# Altium footprint library Alhambra_II.PcbLib: 43 footprints (part 2 of 3)
Each footprint in its own frame and in the unit in brackets; x right, y up, seen from the top. Pads: shape width x height; smd on the part's side, far side on the other; paste and mask are expansions set on the pad; w line width, h text height; cw(c..) or ccw(c..) is an arc to the next point about the centre after c.
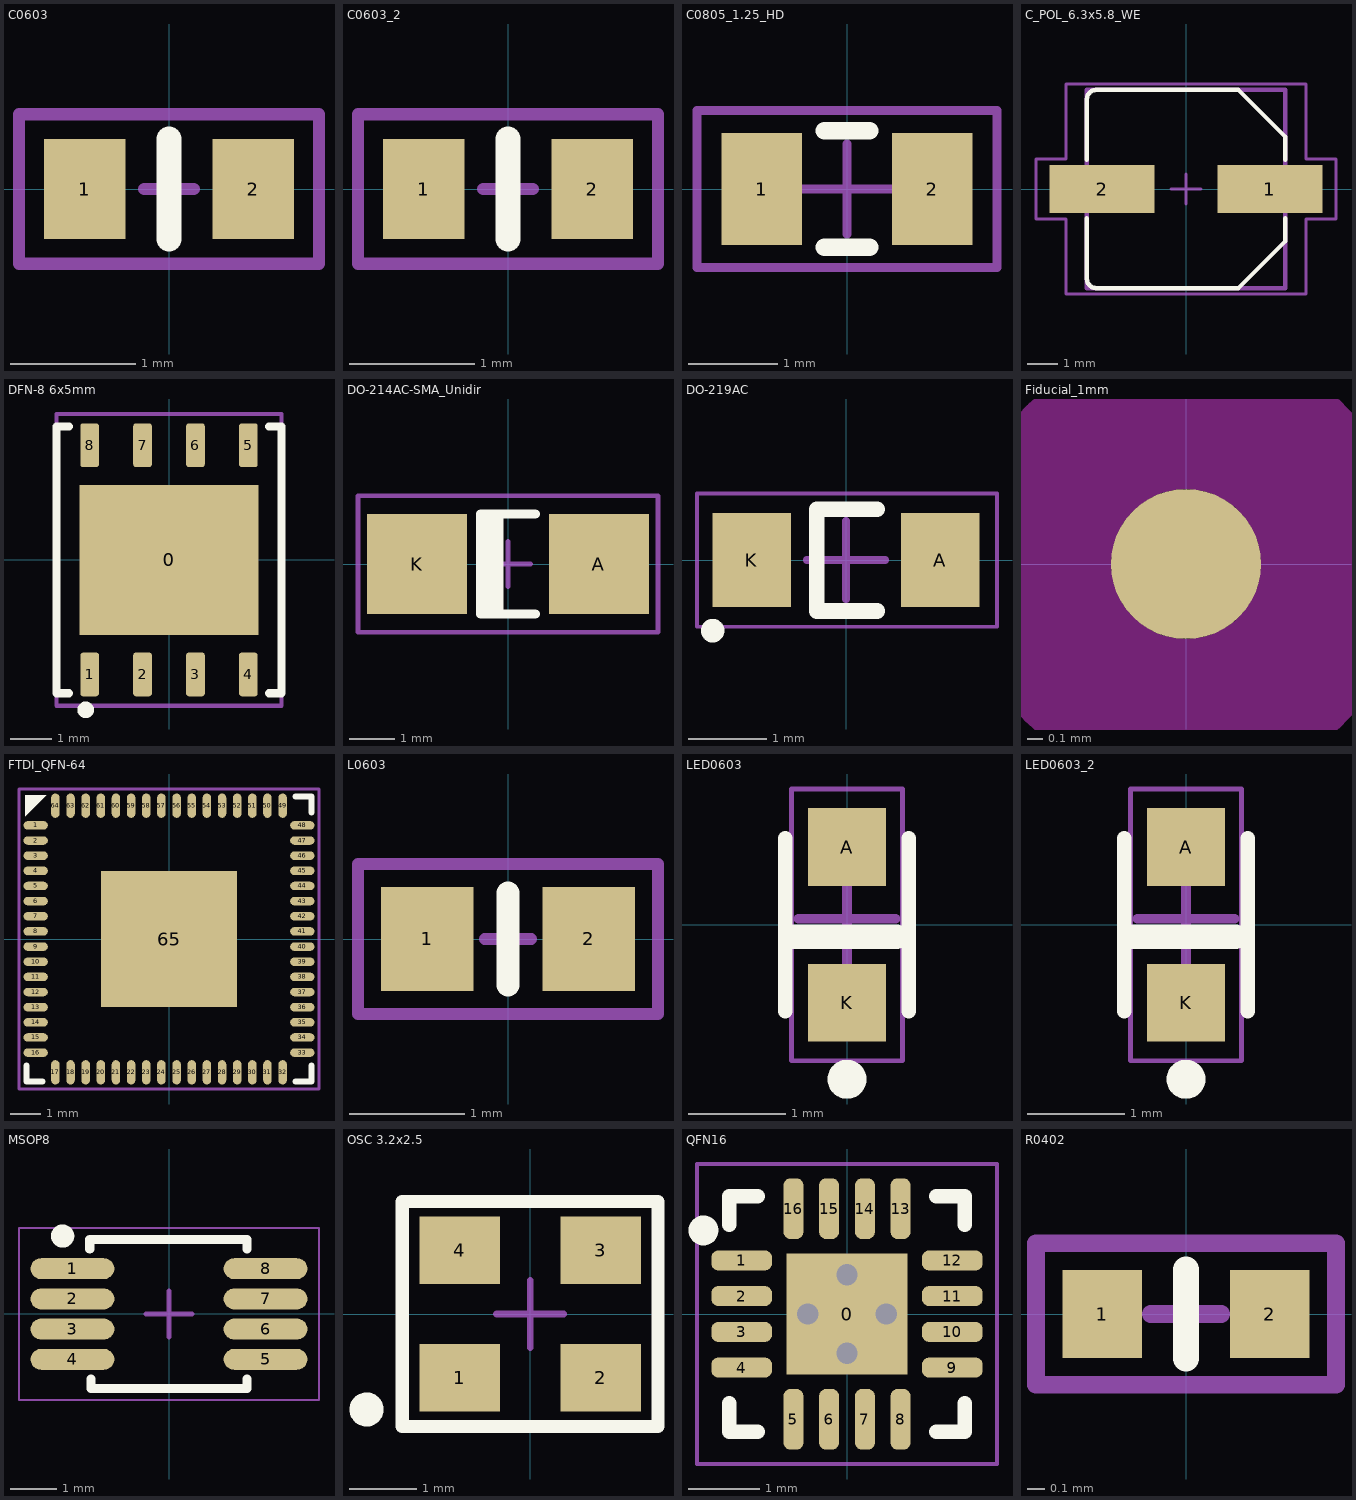
[diagram p1: the footprints below, top view; thin cyan lines are the x and y axes]

## C0603 [mm] "Chip Capacitor, Body 1.6x0.8mm, IPC High Density"
height 0.35
pads (2):
  rect 0.65x0.8 smd: 1(-0.675,0) 2(0.675,0)
Top Overlay:
  lines w0.2: 0,-0.4 0,0.4
Mechanical 15:
  lines w0.1: -0.2,0 0.2,0 ; 0,-0.2 0,0.2 ; -1.2,-0.6 -1.2,0.6 1.2,0.6 1.2,-0.6 -1.2,-0.6
3D body "C_0603.step": height 0.6, standoff 0, extent -0.8,-0.4 0.8,0.4

## C0603_2 [mm]
pads (2):
  rect 0.65x0.8 smd: 1(-0.675,0) 2(0.675,0)
Top Overlay:
  lines w0.2: 0,-0.4 0,0.4
Mechanical 15:
  lines w0.1: -0.2,0 0.2,0 ; 0,-0.2 0,0.2 ; -1.2,-0.6 1.2,-0.6 1.2,0.6 -1.2,0.6 -1.2,-0.6
3D body "C_0603.step": height 0.6, standoff 0, extent -0.8,-0.4 0.8,0.4

## C0805_1.25_HD [mm] "Chip Capacitor, Body 2.0x1.25mm, High Density"
height 1.25
pads (2):
  rect 0.9x1.25 smd: 1(-0.95,0) 2(0.95,0)
Top Overlay:
  lines w0.2: -0.25,-0.65 0.25,-0.65 ; -0.25,0.65 0.25,0.65
Mechanical 15:
  lines w0.1: -0.5,0 0.5,0 ; 0,-0.5 0,0.5 ; -1.675,-0.875 -1.675,0.875 1.675,0.875 1.675,-0.875 -1.675,-0.875
3D body "C0805_1.25.step": height 1.25, standoff 0, extent -1,-0.625 1,0.625

## C_POL_6.3x5.8_WE [mm] "Aluminium Polymer V-Chip SMT Capacitors, §¶6.3x5.8mm"
height 5.8
pads (2):
  rect 3.5x1.6 smd: 1(2.8,0) 2(-2.8,0)
Top Overlay:
  lines w0.15: -3.3,-3 ccw(c-3,-3) -3,-3.3 1.75,-3.3 3.3,-1.75 3.3,-0.98 ; -3.3,-2.99 -3.3,-0.98 ; -3.3,0.98 -3.3,2.99 ; -3.3,3 cw(c-3,3) -3,3.3 1.75,3.3 3.3,1.75 3.3,0.98
Mechanical 13:
  lines w0.15: -3.3,-3.3 -3.3,3.3 3.3,3.3 3.3,-3.3 -3.3,-3.3
Mechanical 15:
  lines w0.1: -0.5,0 0.5,0 ; 0,-0.5 0,0.5 ; -5,-1 -4,-1 -4,-3.5 4,-3.5 4,-1 5,-1 5,1 4,1 4,3.5 -4,3.5 -4,1 -5,1 -5,-1
3D body "plsp 6_3x5_8x2_220.step": height 5.8, standoff 0, extent -3.65,-3.3 3.65,3.3

## DFN-8 6x5mm [mm] "V-PDFN-8 (MLP8), 6x5mm, 8 pin, 1.27mm Pitch"
height 0.85
pads (9):
  rect 4.3x3.6 smd paste-5: 0(0,0)
  rrect30% 0.45x1.05 smd: 1(-1.905,-2.75) 2(-0.635,-2.75) 3(0.635,-2.75) 4(1.905,-2.75) 5(1.905,2.75) 6(0.635,2.75) 7(-0.635,2.75) 8(-1.905,2.75)
Top Overlay:
  circle w0.2: c-2,-3.6 r0.1
  lines w0.2: -2.4,-3.2 -2.7,-3.2 -2.7,3.2 -2.4,3.2 ; 2.4,-3.2 2.7,-3.2 2.7,3.2 2.4,3.2
Top Paste:
  rectangle: -1.7,-1.4 -0.2,-0.3
  region: 1.7,-0.3 0.2,-0.3 0.2,-1.4 1.7,-1.4
  region: 1.7,1.4 0.2,1.4 0.2,0.3 1.7,0.3
  rectangle: -1.7,0.3 -0.2,1.4
Mechanical 15:
  lines w0.1: -0.5,0 0.5,0 ; 0,-0.5 0,0.5 ; -2.7,-3.5 2.7,-3.5 2.7,3.5 -2.7,3.5 -2.7,-3.5
3D body "User Library-DFN8-5X6.STEP": height 0.95, standoff 0, extent -2.5,-3.05 2.5,3.05

## DO-214AC-SMA_Unidir [mm] "SMA Diode, DO-214AC"
height 2.3
pads (2):
  rect 2.2x2.2 smd: A(2,0) K(-2,0)
Top Overlay:
  rectangle: -0.7,-1.1 -0.1,1.1
  lines w0.2: -0.6,-1.1 0.6,-1.1 ; -0.6,1.1 0.6,1.1
Mechanical 15:
  lines w0.1: -0.5,0 0.5,0 ; 0,-0.5 0,0.5 ; -3.3,-1.5 -3.3,1.5 3.3,1.5 3.3,-1.5 -3.3,-1.5
3D body "User Library-Diode Molded Body.STEP": height 2.41, standoff -0.03, extent -2.5,-1.35 2.5,1.35

## DO-219AC [mm] "Diode 2.50x1,30mm, IPC Medium Density"
height 0.6
pads (2):
  rect 1x1.2 smd: A(1.2,0) K(-1.2,0)
Top Overlay:
  circle w0.2: c-1.7,-0.9 r0.05
  lines w0.2: 0.4,-0.65 -0.375,-0.65 -0.375,0.65 0.4,0.65
Mechanical 15:
  lines w0.05: -1.9,-0.85 1.925,-0.85 1.925,0.85 -1.9,0.85 -1.9,-0.85
  lines w0.1: -0.5,0 0.5,0 ; 0,-0.5 0,0.5
3D body "DO-219_AC.stp": height 0.6, standoff 0, extent -1.25,-0.65 1.25,0.65

## Fiducial_1mm [mm] "Marcas Fiduciales para montador"
height 0.5
pads (1):
  round 1 smd paste-2 mask+1: ""(0,0)
Top Layer keep-out:
  circle w1: c0,0 r1

## FTDI_QFN-64 [mm] "QFN,64-Leads, Body 9x9mm, Pitch 0.5mm, Thermal Pad 4.3x4.3mm, NO thermal vias"
height 1
pads (65):
  oval 0.8x0.28 smd: 1(-4.4,3.75) 2(-4.4,3.25) 3(-4.4,2.75) 4(-4.4,2.25) 5(-4.4,1.75) 6(-4.4,1.25) 7(-4.4,0.75) 8(-4.4,0.25) 9(-4.4,-0.25) 10(-4.4,-0.75) 11(-4.4,-1.25) 12(-4.4,-1.75) 13(-4.4,-2.25) 14(-4.4,-2.75) 15(-4.4,-3.25) 16(-4.4,-3.75) 33(4.4,-3.75) 34(4.4,-3.25) 35(4.4,-2.75) 36(4.4,-2.25) 37(4.4,-1.75) 38(4.4,-1.25) 39(4.4,-0.75) 40(4.4,-0.25) 41(4.4,0.25) 42(4.4,0.75) 43(4.4,1.25) 44(4.4,1.75) 45(4.4,2.25) 46(4.4,2.75) 47(4.4,3.25) 48(4.4,3.75)
  oval 0.28x0.8 smd: 17(-3.75,-4.4) 18(-3.25,-4.4) 19(-2.75,-4.4) 20(-2.25,-4.4) 21(-1.75,-4.4) 22(-1.25,-4.4) 23(-0.75,-4.4) 24(-0.25,-4.4) 25(0.25,-4.4) 26(0.75,-4.4) 27(1.25,-4.4) 28(1.75,-4.4) 29(2.25,-4.4) 30(2.75,-4.4) 31(3.25,-4.4) 32(3.75,-4.4) 49(3.75,4.4) 50(3.25,4.4) 51(2.75,4.4) 52(2.25,4.4) 53(1.75,4.4) 54(1.25,4.4) 55(0.75,4.4) 56(0.25,4.4) 57(-0.25,4.4) 58(-0.75,4.4) 59(-1.25,4.4) 60(-1.75,4.4) 61(-2.25,4.4) 62(-2.75,4.4) 63(-3.25,4.4) 64(-3.75,4.4)
  rect 4.5x4.5 smd paste-5: 65(0,0)
Top Overlay:
  region: -4.75,4.75 -4.75,4.2 -4.75,4.05 -4.05,4.75
  lines w0.2: -4.7,-4.175 -4.7,-4.7 -4.175,-4.7 ; 4.175,-4.7 4.7,-4.7 4.7,-4.175 ; 4.175,4.7 4.7,4.7 4.7,4.175
Top Paste:
  rectangle: -1.85,-1.85 -0.35,-0.35
  region: 1.85,-0.35 0.35,-0.35 0.35,-1.85 1.85,-1.85
  region: 1.85,1.85 0.35,1.85 0.35,0.35 1.85,0.35
  rectangle: -1.85,0.35 -0.35,1.85
Mechanical 15:
  lines w0.1: -0.5,0 0.5,0 ; 0,-0.5 0,0.5 ; -4.95,-4.95 -4.95,4.95 4.95,4.95 4.95,-4.95 -4.95,-4.95
3D body "FTDI_QFN-64.step": height 0.99, standoff 0.04, extent -4.52,-4.52 4.52,4.52

## L0603 [mm] "Chip Inductor, Body 1.6x0.8mm, IPC High Density"
height 0.9
pads (2):
  rect 0.8x0.9 smd: 1(-0.7,0) 2(0.7,0)
Top Overlay:
  lines w0.2: 0,-0.4 0,0.4
Mechanical 15:
  lines w0.1: -0.2,0 0.2,0 ; 0,-0.2 0,0.2 ; -1.3,-0.65 1.3,-0.65 1.3,0.65 -1.3,0.65 -1.3,-0.65
3D body "CAP_0603L.step": height 0.6, standoff 0, extent -0.81,-0.4 0.79,0.4

## LED0603 [mm] "0603 1.6x0.8mm"
height 0.8
pads (2):
  rect 0.8x0.8 smd: A(0,0.8) K(0,-0.8)
Top Overlay:
  circle w0.2: c0,-1.587 r0.1
  lines w0.15: -0.635,-0.889 -0.635,0.889 ; 0.635,-0.889 0.635,0.889
  lines w0.25: -0.572,-0.123 0.508,-0.123
Mechanical 15:
  lines w0.05: -0.572,-1.397 0.572,-1.397 0.572,1.397 -0.572,1.397 -0.572,-1.397
  lines w0.1: -0.5,0.064 0.5,0.064 ; 0,-0.5 0,0.5
3D body "User Library-LED SMD0603.step": height 0.68, standoff 0, extent -0.368,-0.807 0.357,0.843

## LED0603_2 [mm]
pads (2):
  rect 0.8x0.8 smd: A(0,0.8) K(0,-0.8)
Top Overlay:
  circle w0.2: c0,-1.587 r0.1
  lines w0.15: -0.635,-0.889 -0.635,0.889 ; 0.635,-0.889 0.635,0.889
  lines w0.25: -0.572,-0.123 0.508,-0.123
Mechanical 15:
  lines w0.05: -0.572,-1.397 -0.572,1.397 0.572,1.397 0.572,-1.397 -0.572,-1.397
  lines w0.1: -0.5,0.064 0.5,0.064 ; 0,-0.5 0,0.5
3D body "User Library-LED SMD0603.step": height 0.68, standoff 0, extent -0.368,-0.807 0.357,0.843

## MSOP8 [mm] "Mini SOP, 8-lead, 0.65mm pitch, 3.0x3.0mm"
height 0.95
pads (8):
  oval 1.8x0.45 smd mask+0.05: 1(-2.075,0.975) 2(-2.075,0.325) 3(-2.075,-0.325) 4(-2.075,-0.975) 5(2.075,-0.975) 6(2.075,-0.325) 7(2.075,0.325) 8(2.075,0.975)
Top Overlay:
  circle w0.25: c-2.286,1.676 r0.125
  lines w0.2: -1.702,1.397 -1.702,1.6 1.676,1.6 1.676,1.397 ; -1.676,-1.397 -1.676,-1.6 1.676,-1.6 1.676,-1.397
Mechanical 15:
  lines w0.05: -3.225,-1.85 -3.225,1.85 3.225,1.85 3.225,-1.85 -3.225,-1.85
  lines w0.1: -0.5,0 0.5,0 ; 0,-0.5 0,0.5
3D body "MSOP-8_3x3mm_Pitch0.65mm.step": height 1, standoff 0, extent -2.57,-1.6 2.57,1.6

## OSC 3.2x2.5 [mm] "Oscillator 3.2x2.5mm, 4 leads."
height 0.85
pads (4):
  rect 1.2x1 smd: 1(-1.05,-0.95) 2(1.05,-0.95) 3(1.05,0.95) 4(-1.05,0.95)
Top Overlay:
  circle w0.254: c-2.438,-1.422 r0.127
  lines w0.2: -1.905,-1.676 -1.905,1.676 1.905,1.676 1.905,-1.676 -1.905,-1.676
Mechanical 15:
  lines w0.1: -0.5,0 0.5,0 ; 0,-0.5 0,0.5 ; -1.905,-1.676 -1.905,1.676 1.905,1.676 1.905,-1.676 -1.905,-1.676
3D body "User Library-XTAL-3_2x2_5.STEP": height 0.91, standoff -0.01, extent -1.6,-1.254 1.6,1.246

## QFN16 [mm] "QFN 16-Lead, 3x3mm body, IPC Medium Density"
height 0.8
pads (17):
  rect 1.7x1.7 smd paste-1: 0(0,0)
  rrect70% 0.85x0.28 smd mask+0.07: 1(-1.475,0.75) 2(-1.475,0.25) 3(-1.475,-0.25) 4(-1.475,-0.75) 9(1.475,-0.75) 10(1.475,-0.25) 11(1.475,0.25) 12(1.475,0.75)
  rrect70% 0.28x0.85 smd mask+0.07: 5(-0.75,-1.475) 6(-0.25,-1.475) 7(0.25,-1.475) 8(0.75,-1.475) 13(0.75,1.475) 14(0.25,1.475) 15(-0.25,1.475) 16(-0.75,1.475)
via 0,0.55 diameter 0.6 hole 0.3
via -0.55,0 diameter 0.6 hole 0.3
via 0.55,0 diameter 0.6 hole 0.3
via 0,-0.55 diameter 0.6 hole 0.3
Top Overlay:
  circle w0.3: c-2.01,1.17 r0.058
  lines w0.2: -1.65,-1.25 -1.65,-1.65 -1.25,-1.65 ; -1.65,1.25 -1.65,1.65 -1.25,1.65 ; 1.25,-1.65 1.65,-1.65 1.65,-1.25 ; 1.25,1.65 1.65,1.65 1.65,1.25
Top Paste:
  region: -0.8,0.8 -0.8,0.2 -0.2,0.2 -0.2,0.8
  region: 0.2,0.8 0.2,0.2 0.8,0.2 0.8,0.8
  region: -0.2,-0.2 -0.8,-0.2 -0.8,-0.8 -0.2,-0.8
  region: 0.8,-0.2 0.2,-0.2 0.2,-0.8 0.8,-0.8
Mechanical 15:
  lines w0.05: -2.1,-2.1 -2.1,2.1 2.1,2.1 2.1,-2.1 -2.1,-2.1
  lines w0.1: -0.5,0 0.5,0 ; 0,-0.5 0,0.5
3D body "User Library-QFN-16.step": height 0.9, standoff 0, extent -1.501,-1.501 1.501,1.501

## R0402 [mm] "Chip Resistor, Body 1.0x0.5mm, IPC High Density"
height 0.25
pads (2):
  rect 0.45x0.5 smd: 1(-0.475,0) 2(0.475,0)
Top Overlay:
  lines w0.15: 0,-0.25 0,0.25
Mechanical 15:
  lines w0.1: -0.2,0 0.2,0 ; 0,-0.2 0,0.2 ; -0.85,-0.4 -0.85,0.4 0.85,0.4 0.85,-0.4 -0.85,-0.4
3D body "R_0402.step": height 0.3, standoff 0, extent -0.5,-0.25 0.5,0.25